# Altium footprint library UAARG Autopilot.PcbLib: 95 footprints (part 2 of 6)
Each footprint in its own frame and in the unit in brackets; x right, y up, seen from the top. Pads: shape width x height; smd on the part's side, far side on the other; paste and mask are expansions set on the pad; w line width, h text height; cw(c..) or ccw(c..) is an arc to the next point about the centre after c.
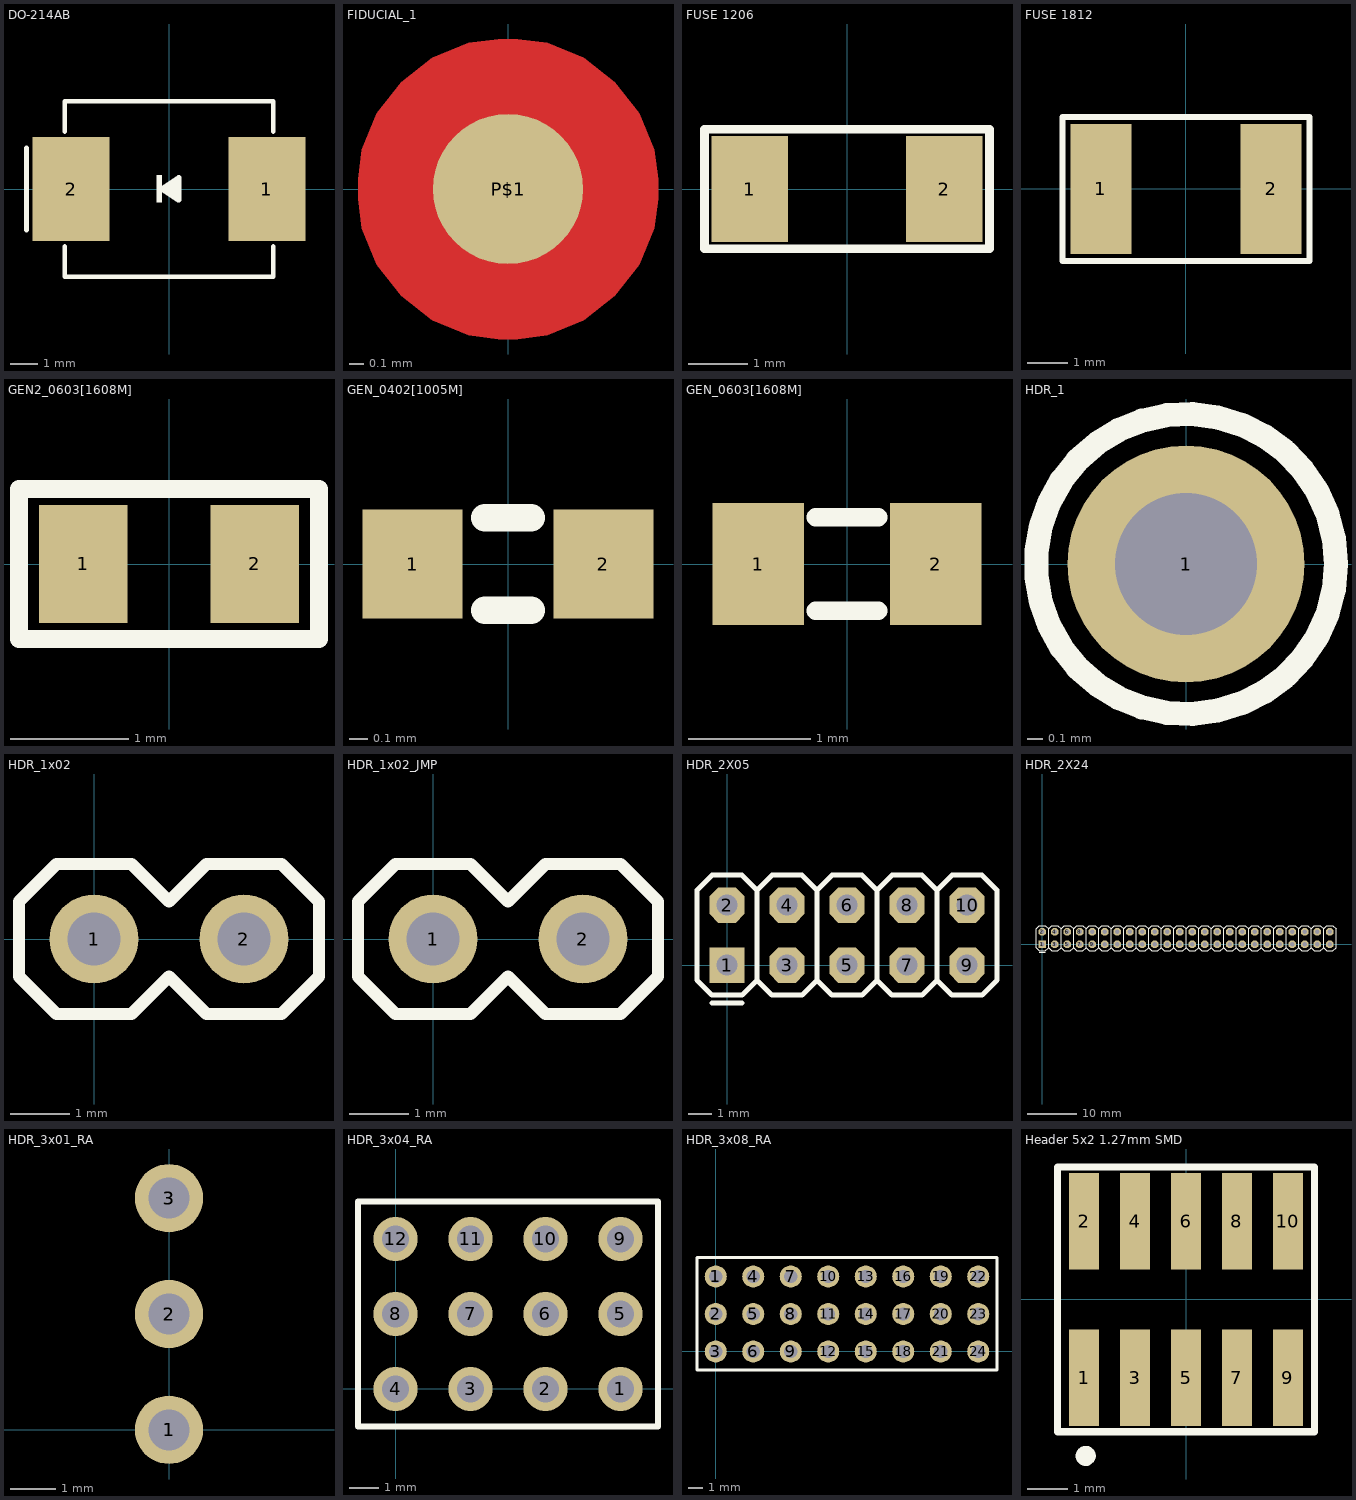
[diagram p1: the footprints below, top view; thin cyan lines are the x and y axes]

## DO-214AB [mm] "DO-214AB, SMC, 8.2mm x 6.1mm x 2.4mm (LxWxH)"
height 2.4
pads (2):
  rect 2.8x3.8 smd: 1(3.568,0) 2(-3.568,0)
Top Overlay:
  rectangle: -0.451,-0.5 -0.251,0.508
  region: -0.1,0 0.3,0.268 0.3,-0.263
  lines w0.178: -5.2,-1.5 -5.2,1.5 ; -3.8,-2.1 -3.8,-3.2 3.8,-3.2 3.8,-2.1 ; -3.8,2.1 -3.8,3.2 3.8,3.2 3.8,2.1
  lines w0.203: -0.25,0 0.356,0.407 0.356,-0.4 -0.25,0
3D body: height 2.4, standoff 0.03, extent -4.065,-3.05 4.065,3.05

## FIDUCIAL_1 [mil] "Fiducial model 1"
pads (1):
  rrect100% 40x40 smd paste-20 mask+20: P$1(0,0)
Top Layer:
  pour cut-out: 0,-40 -2.62,-40 -10.44,-38.97 -20.17,-34.94 -28.53,-28.53 -34.94,-20.17 -38.97,-10.44 -40,-2.62 -40,0 -40,2.62 -38.97,10.44 -34.94,20.17 -28.53,28.53 -20.17,34.94 -10.44,38.97 -2.62,40 0,40 2.62,40 10.44,38.97 20.17,34.94 28.53,28.53 34.94,20.17 38.97,10.44 40,2.62 40,0 40,-2.62 38.97,-10.44 34.94,-20.17 28.53,-28.53 20.17,-34.94 10.44,-38.97 2.62,-40

## FUSE 1206 [mm] "FUSE SMD 1206"
height 0.85
pads (2):
  rect 1.3x1.8 smd: 1(-1.65,0) 2(1.65,0)
Top Overlay:
  lines w0.152: -2.425,-1.016 -2.425,1.016 2.425,1.016 2.425,-1.016 -2.425,-1.016
3D body: height 0.56, standoff 0, extent -1.601,-0.826 1.601,0.826

## FUSE 1812 [mm] "FUSE SMD 1812"
height 0.85
pads (2):
  rect 1.5x3.2 smd: 1(-2.1,0) 2(2.1,0)
Top Overlay:
  lines w0.152: -3.048,-1.778 -3.048,1.778 3.048,1.778 3.048,-1.778 -3.048,-1.778
3D body: height 1.34, standoff 0, extent -2.365,-1.705 2.365,1.705

## GEN2_0603[1608M] [mm] "Chip SMD Generic Component, Body 1.6x0.8mm, IPC Low Density"
height 0.6
pads (2):
  rect 0.75x1 smd: 1(-0.725,0) 2(0.725,0)
Top Overlay:
  lines w0.152: -1.27,-0.635 1.27,-0.635 1.27,0.635 -1.27,0.635 -1.27,-0.635
3D body: height 0.9, standoff 0, extent -0.8,-0.4 0.8,0.4

## GEN_0402[1005M] [mm] "Chip SMD Generic Component, Body 1.0x0.5mm, IPC Low Density"
height 0.4
pads (2):
  rect 0.55x0.6 smd: 1(-0.525,0) 2(0.525,0)
Top Overlay:
  lines w0.152: -0.127,-0.254 0.127,-0.254 ; -0.127,0.254 0.127,0.254
3D body: height 0.6, standoff 0, extent -0.5,-0.25 0.5,0.25

## GEN_0603[1608M] [mm] "Chip SMD Generic Component, Body 1.6x0.8mm, IPC Low Density"
height 0.6
pads (2):
  rect 0.75x1 smd: 1(-0.725,0) 2(0.725,0)
Top Overlay:
  lines w0.152: -0.254,-0.381 0.254,-0.381 ; -0.254,0.381 0.254,0.381
3D body: height 0.9, standoff 0, extent -0.8,-0.4 0.8,0.4

## HDR_1 [mm]
pads (1):
  round 1.5 hole 0.9: 1(0,0)
Top Overlay:
  circle w0.152: c0,0 r0.95

## HDR_1x02 [mm] "Header 2 positions"
pads (2):
  round 1.5 hole 0.9: 1(0,0) 2(2.54,0)
Top Overlay:
  lines w0.203: -1.27,-0.635 -0.635,-1.27 0.635,-1.27 1.27,-0.635 1.905,-1.27 3.175,-1.27 3.81,-0.635 3.81,0.635 3.175,1.27 1.905,1.27 1.27,0.635 0.635,1.27 -0.635,1.27 -1.27,0.635 -1.27,-0.635
3D body: height 8.6, standoff -3, extent -1.17,-1.246 3.91,1.253

## HDR_1x02_JMP [mm] "Header 2 positions"
pads (2):
  round 1.5 hole 0.9: 1(0,0) 2(2.54,0)
Top Overlay:
  lines w0.203: -1.27,-0.635 -0.635,-1.27 0.635,-1.27 1.27,-0.635 1.905,-1.27 3.175,-1.27 3.81,-0.635 3.81,0.635 3.175,1.27 1.905,1.27 1.27,0.635 0.635,1.27 -0.635,1.27 -1.27,0.635 -1.27,-0.635
Multi-Layer:
  rectangle: 0,-0.75 0.75,0.75
  region: 2.54,0.75 1.79,0.75 1.79,-0.75 2.54,-0.75
3D body: height 8.6, standoff -3, extent -1.17,-1.246 3.91,1.253

## HDR_2X05 [mm] "Connector; Header; 2x05 Position"
pads (10):
  rect 1.5x1.5 hole 0.9: 1(0,0)
  oct 1.5x1.5 hole 0.9: 2(0,2.54) 3(2.54,0) 4(2.54,2.54) 5(5.08,0) 6(5.08,2.54) 7(7.62,0) 8(7.62,2.54) 9(10.16,0) 10(10.16,2.54)
Top Overlay:
  lines w0.203: -0.635,-1.605 0.635,-1.605 ; 1.27,-0.635 1.905,-1.27 3.175,-1.27 3.81,-0.635 ; 1.27,-0.635 1.27,3.175 ; 1.27,-0.635 0.635,-1.27 -0.635,-1.27 -1.27,-0.635 -1.27,3.175 -0.635,3.81 0.635,3.81 1.27,3.175 ; 1.27,3.175 1.905,3.81 3.175,3.81 3.81,3.175 ; 3.81,-0.635 4.445,-1.27 5.715,-1.27 6.35,-0.635 ; 3.81,-0.635 3.81,3.175 ; 3.81,3.175 4.445,3.81 5.715,3.81 6.35,3.175 ; 6.35,-0.635 6.985,-1.27 8.255,-1.27 8.89,-0.635 ; 6.35,-0.635 6.35,3.175 ; 6.35,3.175 6.985,3.81 8.255,3.81 8.89,3.175 ; 8.89,-0.635 8.89,3.175 ; 8.89,-0.635 9.525,-1.27 10.795,-1.27 11.43,-0.635 11.43,3.175 10.795,3.81 9.525,3.81 8.89,3.175
3D body: height 5, standoff -3, extent -1.27,-10.02 11.43,2.86

## HDR_2X24 [mm] "Connector; Header; 2x24 Position"
pads (48):
  rect 1.5x1.5 hole 0.9: 1(0,0)
  oct 1.5x1.5 hole 0.9: 2(0,2.54) 3(2.54,0) 4(2.54,2.54) 5(5.08,0) 6(5.08,2.54) 7(7.62,0) 8(7.62,2.54) 9(10.16,0) 10(10.16,2.54) 11(12.7,0) 12(12.7,2.54) 13(15.24,0) 14(15.24,2.54) 15(17.78,0) 16(17.78,2.54) 17(20.32,0) 18(20.32,2.54) 19(22.86,0) 20(22.86,2.54) 21(25.4,0) 22(25.4,2.54) 23(27.94,0) 24(27.94,2.54) 25(30.48,0) 26(30.48,2.54) 27(33.02,0) 28(33.02,2.54) 29(35.56,0) 30(35.56,2.54) 31(38.1,0) 32(38.1,2.54) 33(40.64,0) 34(40.64,2.54) 35(43.18,0) 36(43.18,2.54) 37(45.72,0) 38(45.72,2.54) 39(48.26,0) 40(48.26,2.54) 41(50.8,0) 42(50.8,2.54) 43(53.34,0) 44(53.34,2.54) 45(55.88,0) 46(55.88,2.54) 47(58.42,0) 48(58.42,2.54)
Top Overlay:
  drawing of 170 lines, arcs and shapes, not listed
3D body: height 8.5, standoff -3, extent -1.27,-1.27 59.69,3.81

## HDR_3x01_RA [mm] "Connector; Header; 3 Position, 3 rows, 1 pins per row, right angle"
pads (6):
  round 1.5 hole 0.9: 1(0,0) 1(0,0) 2(0,2.54) 2(0,2.54) 3(0,5.08) 3(0,5.08)
3D body: height 7.62, standoff -2.62, extent -1.27,-10.06 1.27,5.4

## HDR_3x04_RA [mm] "Connector; Header; 12 Position, 3 rows, 4 pins per row, right angle"
pads (12):
  round 1.5 hole 0.9: 1(7.62,0) 2(5.08,0) 3(2.54,0) 4(0,0) 5(7.62,2.54) 6(5.08,2.54) 7(2.54,2.54) 8(0,2.54) 9(7.62,5.08) 10(5.08,5.08) 11(2.54,5.08) 12(0,5.08)
Top Overlay:
  lines w0.203: -1.27,-1.27 -1.27,6.35 8.89,6.35 8.89,-1.27 -1.27,-1.27
3D body: height 7.19, standoff -3.23, extent -1.27,-9.906 8.89,5.398

## HDR_3x08_RA [mm] "Connector; Header; 24 Position, 3 rows, 8 pins per row, right angle"
pads (24):
  round 1.5 hole 0.9: 1(0,5.08) 2(0,2.54) 3(0,0) 4(2.54,5.08) 5(2.54,2.54) 6(2.54,0) 7(5.08,5.08) 8(5.08,2.54) 9(5.08,0) 10(7.62,5.08) 11(7.62,2.54) 12(7.62,0) 13(10.16,5.08) 14(10.16,2.54) 15(10.16,0) 16(12.7,5.08) 17(12.7,2.54) 18(12.7,0) 19(15.24,5.08) 20(15.24,2.54) 21(15.24,0) 22(17.78,5.08) 23(17.78,2.54) 24(17.78,0)
Top Overlay:
  lines w0.203: -1.27,-1.27 19.05,-1.27 19.05,6.35 -1.27,6.35 -1.27,-1.27
3D body: height 7.19, standoff -3.23, extent -1.27,-9.906 19.05,5.398

## Header 5x2 1.27mm SMD [mm] "Header 10pos, 5x2, pitch 1.27mm SMD"
height 4.68
pads (10):
  rect 0.75x2.4 smd: 1(-2.54,-1.95) 2(-2.54,1.95) 3(-1.27,-1.95) 4(-1.27,1.95) 5(0,-1.95) 6(0,1.95) 7(1.27,-1.95) 8(1.27,1.95) 9(2.54,-1.95) 10(2.54,1.95)
Top Overlay:
  circle w0.25: c-2.5,-3.9 r0.125
  lines w0.178: -3.2,-3.3 3.2,-3.3 3.2,3.3 -3.2,3.3 -3.2,-3.3
3D body: height 6.12, standoff 0, extent -3.137,-2.921 3.137,2.921